# Altium footprint library Horizont_11_12_2017.PcbLib: 257 footprints (part 14 of 17)
Each footprint in its own frame and in the unit in brackets; x right, y up, seen from the top. Pads: shape width x height; smd on the part's side, far side on the other; paste and mask are expansions set on the pad; w line width, h text height; cw(c..) or ccw(c..) is an arc to the next point about the centre after c.
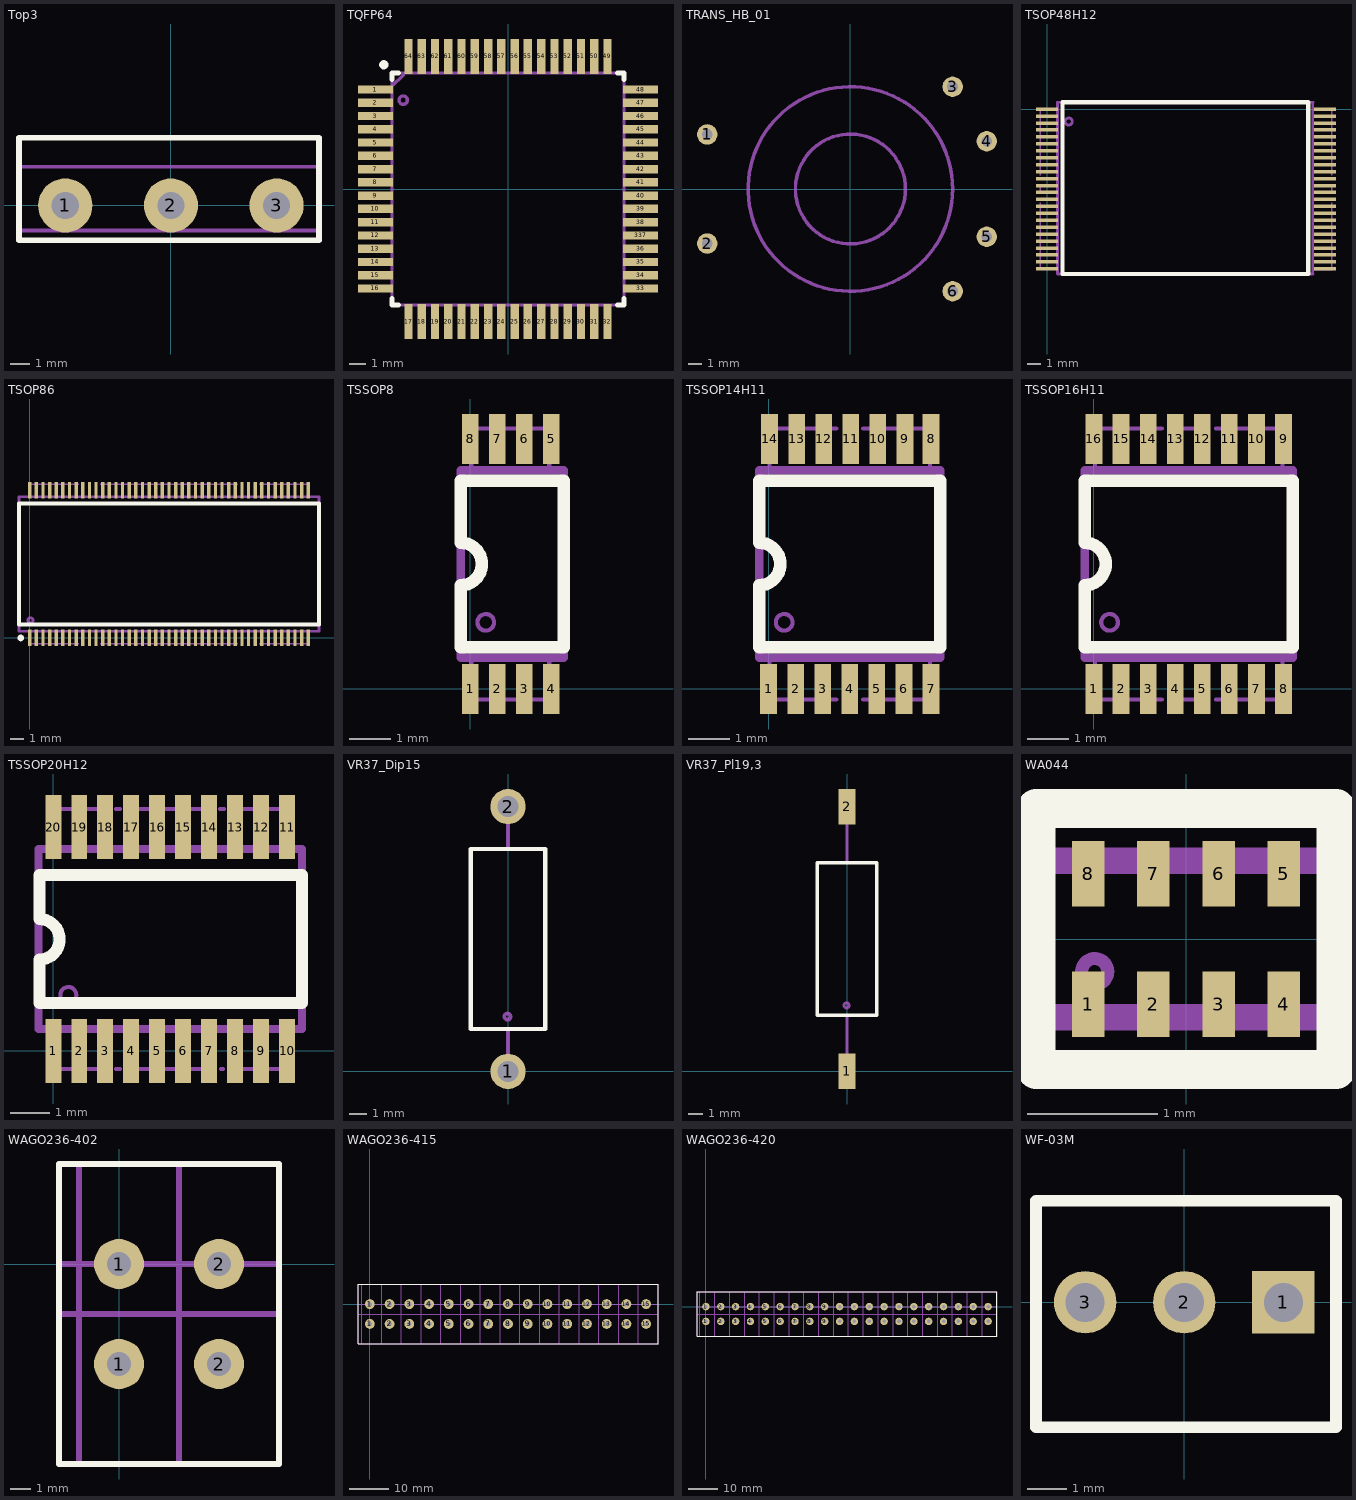
[diagram p13: the footprints below, top view; thin cyan lines are the x and y axes]

## Top3 [mm]
height 26.5
pads (3):
  round 2.8 hole 1.4: 1(-5.46,0) 2(0,0) 3(5.46,0)
Top Overlay:
  lines w0.3: -7.85,-1.8 7.65,-1.8 7.65,3.5 -7.85,3.5 -7.85,-1.8
Mechanical 1:
  lines w0.2: -7.85,2 7.65,2 ; -7.85,-1.3 -7.85,3.5 7.65,3.5 7.65,-1.3 -7.85,-1.3
  text ".Designator" at -2.9,-0.3 h1.5
3D body "top3.stp": height 28.1, standoff -3, extent -7.75,-1.4 7.75,3.2

## TQFP64 [mm]
height 1.2
pads (64):
  rect 2.1x0.5 smd: 1(-8,6) 2(-8,5.2) 3(-8,4.4) 4(-8,3.6) 5(-8,2.8) 6(-8,2) 7(-8,1.2) 8(-8,0.4) 9(-8,-0.4) 10(-8,-1.2) 11(-8,-2) 12(-8,-2.8) 13(-8,-3.6) 14(-8,-4.4) 15(-8,-5.2) 16(-8,-6) 33(8,-6) 34(8,-5.2) 35(8,-4.4) 36(8,-3.6) 38(8,-2) 39(8,-1.2) 40(8,-0.4) 41(8,0.4) 42(8,1.2) 43(8,2) 44(8,2.8) 45(8,3.6) 46(8,4.4) 47(8,5.2) 48(8,6) 337(8,-2.8)
  rect 0.5x2.1 smd: 17(-6,-8) 18(-5.2,-8) 19(-4.4,-8) 20(-3.6,-8) 21(-2.8,-8) 22(-2,-8) 23(-1.2,-8) 24(-0.4,-8) 25(0.4,-8) 26(1.2,-8) 27(2,-8) 28(2.8,-8) 29(3.6,-8) 30(4.4,-8) 31(5.2,-8) 32(6,-8) 49(6,8) 50(5.2,8) 51(4.4,8) 52(3.6,8) 53(2.8,8) 54(2,8) 55(1.2,8) 56(0.4,8) 57(-0.4,8) 58(-1.2,8) 59(-2,8) 60(-2.8,8) 61(-3.6,8) 62(-4.4,8) 63(-5.2,8) 64(-6,8)
Top Overlay:
  circle w0.3: c-7.493,7.493 r0.127
  lines w0.3: -7,-6.604 -7,-7 -6.604,-7 ; -7,6.604 -7,7 -6.604,7 ; 6.604,-7 7,-7 7,-6.604 ; 6.604,7 7,7 7,6.604
Mechanical 1:
  circle w0.2: c-6.321,5.359 r0.254
  lines w0.2: -7,0 -7,7 7,7 7,-7 -7,-7 -7,-0.1 -7,0.1 ; -7,6.2 -6.3,6.9 -6.3,7
  text "64" at -5.207,5.588 h1.5
  text ".Designator" at -2.377,-0.173 h1.5
3D body "TQFP64_14x14_0,8.STEP": height 1.2, standoff 0, extent -8,-8 8,8

## TRANS_HB_01 [mm]
height 4.2
pads (6):
  round 1.5 hole 0.8: 1(-10.5,4) 2(-10.5,-4) 3(7.5,7.5) 4(10,3.5) 5(10,-3.5) 6(7.5,-7.5)
Mechanical 1:
  circle w0.254: c0,0 r4.031
  circle w0.254: c0,0 r7.5
  text "6" at 8.5,-7 h2
  text "5" at 11,-3 h2
  text "3" at 8.5,8.5 h2
  text "4" at 11,4 h2
  text "2" at -12.5,-4 h2
  text "1" at -12.5,4 h2
  text ".Designator" at -3,10 h1.5

## TSOP48H12 [mm]
height 1.2
pads (48):
  rect 1.6x0.25 smd: 1(0,0) 2(0,-0.5) 3(0,-1) 4(0,-1.5) 5(0,-2) 6(0,-2.5) 7(0,-3) 8(0,-3.5) 9(0,-4) 10(0,-4.5) 11(0,-5) 12(0,-5.5) 13(0,-6) 14(0,-6.5) 15(0,-7) 16(0,-7.5) 17(0,-8) 18(0,-8.5) 19(0,-9) 20(0,-9.5) 21(0,-10) 22(0,-10.5) 23(0,-11) 24(0,-11.5) 25(20,-11.5) 26(20,-11) 27(20,-10.5) 28(20,-10) 29(20,-9.5) 30(20,-9) 31(20,-8.5) 32(20,-8) 33(20,-7.5) 34(20,-7) 35(20,-6.5) 36(20,-6) 37(20,-5.5) 38(20,-5) 39(20,-4.5) 40(20,-4) 41(20,-3.5) 42(20,-3) 43(20,-2.5) 44(20,-2) 45(20,-1.5) 46(20,-1) 47(20,-0.5) 48(20,0)
Top Overlay:
  lines w0.3: 1.1,-11.875 18.8,-11.875 18.8,0.5 1.1,0.5 1.1,-11.875
Mechanical 1:
  circle w0.2: c1.554,-0.891 r0.254
  lines w0.1: -0.5,-11.5 -0.5,-6.75 ; -0.5,-6 -0.5,-5.5 ; -0.5,-4.75 -0.5,0 ; 20.5,-11.5 20.5,-6.75 ; 20.5,-6 20.5,-5.5 ; 20.5,-4.75 20.5,0
  lines w0.2: -0.5,-11.5 0.75,-11.5 ; -0.5,0 0.75,0 ; 19.125,-11.875 19.125,0.5 ; 19.15,-11.875 0.75,-11.875 0.75,0.5 19.15,0.5 ; 19.25,-11.5 20.5,-11.5 ; 19.25,0 20.5,0
  text ".Designator" at 6.873,-5.173 h1.5
  text "48" at 17.4,-1 h1.5
  text ".Comment" at 7.11,-6.65 h1.5
3D body "TSOP48-05h11.stp": height 1.21, standoff 0, extent -0.55,-12 20.45,0.5

## TSOP86 [mm]
height 1.2
pads (86):
  rect 0.25x1.25 smd: 1(0,0) 2(0.5,0) 3(1,0) 4(1.5,0) 5(2,0) 6(2.5,0) 7(3,0) 8(3.5,0) 9(4,0) 10(4.5,0) 11(5,0) 12(5.5,0) 13(6,0) 14(6.5,0) 15(7,0) 16(7.5,0) 17(8,0) 18(8.5,0) 19(9,0) 20(9.5,0) 21(10,0) 22(10.5,0) 23(11,0) 24(11.5,0) 25(12,0) 26(12.5,0) 27(13,0) 28(13.5,0) 29(14,0) 30(14.5,0) 31(15,0) 32(15.5,0) 33(16,0) 34(16.5,0) 35(17,0) 36(17.5,0) 37(18,0) 38(18.5,0) 39(19,0) 40(19.5,0) 41(20,0) 42(20.5,0) 43(21,0) 44(21,11.15) 45(20.5,11.15) 46(20,11.15) 47(19.5,11.15) 48(19,11.15) 49(18.5,11.15) 50(18,11.15) 51(17.5,11.15) 52(17,11.15) 53(16.5,11.15) 54(16,11.15) 55(15.5,11.15) 56(15,11.15) 57(14.5,11.15) 58(14,11.15) 59(13.5,11.15) 60(13,11.15) 61(12.5,11.15) 62(12,11.15) 63(11.5,11.15) 64(11,11.15) 65(10.5,11.15) 66(10,11.15) 67(9.5,11.15) 68(9,11.15) 69(8.5,11.15) 70(8,11.15) 71(7.5,11.15) 72(7,11.15) 73(6.5,11.15) 74(6,11.15) 75(5.5,11.15) 76(5,11.15) 77(4.5,11.15) 78(4,11.15) 79(3.5,11.15) 80(3,11.15) 81(2.5,11.15) 82(2,11.15) 83(1.5,11.15) 84(1,11.15) 85(0.5,11.15) 86(0,11.15)
Top Overlay:
  circle w0.25: c-0.675,0 r0.125
  lines w0.3: -0.8,1.025 21.8,1.025 21.8,10.125 -0.8,10.125 -0.8,1.025
Mechanical 1:
  circle w0.2: c0.05,1.325 r0.2
  lines w0.1: 0,-0.425 3.7,-0.425 ; 0,11.575 3.7,11.575 ; 4.4,-0.425 4.6,-0.425 ; 4.4,11.575 4.6,11.575 ; 5.3,-0.425 15.7,-0.425 ; 5.3,11.575 15.7,11.575 ; 16.4,-0.425 16.6,-0.425 ; 16.4,11.575 16.6,11.575 ; 17.3,-0.425 21,-0.425 ; 17.3,11.575 21,11.575
  lines w0.2: 0,-0.425 0,0.495 ; 0,10.655 0,11.575 ; 21,-0.425 21,0.495 ; 21,10.655 21,11.575 ; -0.81,0.495 21.81,0.495 21.81,10.655 -0.81,10.655 -0.81,0.495
  text ".Designator" at 8.373,5.402 h1.5
  text "86" at -0.25,9.325 h1.5
3D body "TSOP86-05h12.stp": height 1.21, standoff 0, extent -0.81,-0.305 21.81,11.455

## TSSOP8 [mm]
pads (8):
  rect 0.4x1.2 smd: 1(0,0) 2(0.65,0) 3(1.3,0) 4(1.95,0) 5(1.95,6) 6(1.3,6) 7(0.65,6) 8(0,6)
Top Overlay:
  lines w0.3: -0.225,1 2.25,1 2.25,5 -0.225,5 -0.225,3.508 cw(c-0.225,3) -0.225,2.492 -0.225,1
Mechanical 1:
  circle w0.1: c0.375,1.6 r0.2
  lines w0.1: 0.025,0.75 0.025,-0.25 1.9,-0.25 1.9,0.75 ; 0.025,5.25 0.025,6.25 1.9,6.25 1.9,5.25
  lines w0.2: -0.225,0.75 2.25,0.75 2.25,5.25 -0.225,5.25 -0.225,0.75
  text "14" at 0.2,3.87 h1.5
  text ".Comment" at 0.36,2.1 h1.5
  text ".Designator" at 1.62,3.58 h1.5
3D body "TSSOP8.STEP": height 1, standoff 0, extent -0.5,-0.14 2.5,6.14

## TSSOP14H11 [mm]
height 1.1
pads (14):
  rect 0.4x1.2 smd: 1(0,0) 2(0.65,0) 3(1.3,0) 4(1.95,0) 5(2.6,0) 6(3.25,0) 7(3.9,0) 8(3.9,6) 9(3.275,6) 10(2.625,6) 11(1.975,6) 12(1.325,6) 13(0.675,6) 14(0.025,6)
Top Overlay:
  lines w0.3: -0.225,1 -0.225,2.492 ccw(c-0.225,3) -0.225,3.508 -0.225,5 4.125,5 4.125,1 -0.225,1
Mechanical 1:
  circle w0.1: c0.375,1.6 r0.2
  lines w0.1: 0.025,0.75 0.025,-0.25 1.625,-0.25 ; 0.025,5.25 0.025,6.25 1.625,6.25 ; 1.9,-0.25 2,-0.25 ; 1.9,6.25 2,6.25 ; 2.275,-0.25 3.875,-0.25 3.875,0.75 ; 2.275,6.25 3.875,6.25 3.875,5.25
  lines w0.2: -0.225,0.75 -0.225,5.25 4.125,5.25 4.125,0.75 -0.225,0.75
  text ".Designator" at 1.62,3.58 h1.5
  text ".Comment" at 0.36,2.1 h1.5
  text "14" at 0.2,3.87 h1.5
3D body "TSSOP14h11.stp": height 1.11, standoff 0, extent -0.375,-0.3 4.275,6.3

## TSSOP16H11 [mm]
height 1.1
pads (16):
  rect 0.4x1.2 smd: 1(0,0) 2(0.65,0) 3(1.3,0) 4(1.95,0) 5(2.6,0) 6(3.25,0) 7(3.9,0) 8(4.55,0) 9(4.55,6) 10(3.9,6) 11(3.25,6) 12(2.6,6) 13(1.95,6) 14(1.3,6) 15(0.65,6) 16(0,6)
Top Overlay:
  lines w0.3: -0.225,1 4.775,1 4.775,5 -0.225,5 -0.225,3.508 cw(c-0.225,3) -0.225,2.492 -0.225,1
Mechanical 1:
  circle w0.1: c0.375,1.6 r0.2
  lines w0.1: 0.025,0.75 0.025,-0.25 1.625,-0.25 ; 0.025,5.25 0.025,6.25 1.625,6.25 ; 2.075,-0.25 2.475,-0.25 ; 2.075,6.25 2.475,6.25 ; 2.925,-0.25 4.525,-0.25 4.525,0.75 ; 2.925,6.25 4.525,6.25 4.525,5.25
  lines w0.2: -0.225,0.75 4.775,0.75 4.775,5.25 -0.225,5.25 -0.225,0.75
  text "16" at 0.2,3.87 h1.5
  text ".Comment" at 0.36,2.1 h1.5
  text ".Designator" at 1.62,3.58 h1.5
3D body "TSSOP16h11.stp": height 1.11, standoff 0, extent -0.375,-0.3 4.925,6.3

## TSSOP20H12 [mm]
height 1.2
pads (20):
  rect 0.4x1.6 smd: 1(0,0) 2(0.65,0) 3(1.3,0) 4(1.95,0) 5(2.6,0) 6(3.25,0) 7(3.9,0) 8(4.55,0) 9(5.2,0) 10(5.85,0) 11(5.85,5.6) 12(5.2,5.6) 13(4.55,5.6) 14(3.9,5.6) 15(3.25,5.6) 16(2.6,5.6) 17(1.95,5.6) 18(1.3,5.6) 19(0.65,5.6) 20(0,5.6)
Top Overlay:
  lines w0.3: -0.35,1.2 6.225,1.2 6.225,4.4 -0.35,4.4 -0.35,3.3 cw(c-0.35,2.792) -0.35,2.284 -0.35,1.2
Mechanical 1:
  circle w0.1: c0.375,1.4 r0.2
  lines w0.1: 0,6.05 1.3,6.05 ; 0.025,-0.45 1.3,-0.45 ; 1.575,-0.45 1.675,-0.45 ; 1.575,6.05 1.675,6.05 ; 1.95,-0.45 3.9,-0.45 ; 1.95,6.05 3.9,6.05 ; 4.175,6.05 4.275,6.05 ; 4.2,-0.45 4.25,-0.45 ; 4.55,-0.45 5.85,-0.45 ; 4.55,6.05 5.85,6.05
  lines w0.2: 0,-0.45 0,0.55 ; 0,5.05 0,6.05 ; 5.85,-0.45 5.85,0.55 ; 5.85,5.05 5.85,6.05 ; -0.375,0.55 6.225,0.55 6.225,5.05 -0.375,5.05 -0.375,0.55
  text "20" at 0.3,3.55 h1.5
  text ".Comment" at 0.39,1.88 h1.5
  text ".Designator" at 1.98,3.58 h1.5
3D body "TSSOP20h12.stp": height 1.21, standoff 0, extent -0.375,-0.5 6.225,6.1

## VR37_Dip15 [mm]
height 4
pads (2):
  round 2 hole 1.2: 1(0,0) 2(0,15)
Top Overlay:
  lines w0.25: -2.1,2.4 2.1,2.4 2.1,12.6 -2.1,12.6 -2.1,2.4
Mechanical 1:
  circle w0.2: c-0.03,3.1 r0.18
  lines w0.2: 0,0 0,2.4 ; 0,12.6 0,15 ; -2.1,2.4 2.1,2.4 2.1,12.6 -2.1,12.6 -2.1,2.4
  text ".Designator" at 0.4,6.1 h1.5
3D body "С2-33Н-0,5_Dip15.STEP": height 4.2, standoff -3, extent -2.15,-0.248 2.05,15.352

## VR37_Pl19,3 [mm]
height 4
pads (2):
  rect 1.2x2.5 smd: 1(0,0) 2(0,18.75)
Top Overlay:
  lines w0.25: -2.1,3.975 -2.1,14.775 2.1,14.775 2.1,3.975 -2.1,3.975
Mechanical 1:
  circle w0.2: c-0.03,4.675 r0.18
  lines w0.2: 0,-0.275 0,3.975 ; 0,14.775 0,19.025 ; -2.1,3.975 -2.1,14.775 2.1,14.775 2.1,3.975 -2.1,3.975
  text ".Designator" at 0.4,8.1 h1.5
3D body "С2-33Н-0,5_Pl19,3.STEP": height 4.2, standoff 0, extent -2.141,-0.308 2.059,18.992

## WA044 [mm]
height 0.55
pads (8):
  rect 0.25x0.5 smd paste+0 mask+0.05: 1(-0.75,-0.5) 2(-0.25,-0.5) 3(0.25,-0.5) 4(0.75,-0.5) 5(0.75,0.5) 6(0.25,0.5) 7(-0.25,0.5) 8(-0.75,0.5)
Top Overlay:
  lines w0.3: -1.15,-1 -1.15,1 1.15,1 1.15,-1 -1.15,-1
Mechanical 1:
  circle w0.1: c-0.7,-0.25 r0.1
  lines w0.2: -1.15,-0.6 1.15,-0.6 1.15,0.6 -1.15,0.6 -1.15,-0.6
  text "8" at -1.15,0.9 h1.5
  text ".Designator" at -1.65,-2.3 h1.5
3D body "WA044.STEP": height 0.55, standoff 0, extent -1.1,-0.6 1.1,0.6

## WAGO236-402 [mm]
height 13
pads (4):
  round 2.5 hole 1.2: 1(0,-5) 1(0,0) 2(5,-5) 2(5,0)
Top Overlay:
  lines w0.3: -3,-10 8,-10 8,5 -3,5 -3,-10
Mechanical 1:
  circle w0.1: c0.05,-5.42 r0.1
  lines w0.3: -3,-2.5 -2,-2.5 3,-2.5 8,-2.5 ; -3,0 -2,0 3,0 8,0 ; -2,-10 3,-10 ; -2,-10 -2,5 ; -2,-10 -3,-10 -3,5 -2,5 ; -2,5 2.5,5 3,5 ; 3,-10 3,5 ; 3,-10 8,-10 8,5 7.5,5 3,5
  text ".Designator" at -0.6,6.1 h1.5
  text "2" at 4.8,-5.5 h1.5
3D body "WAGO236-402.STEP": height 13.01, standoff -3.99, extent -3,-10 8,5

## WAGO236-415 [mm]
height 13
pads (30):
  round 2.5 hole 1.2: 1(0,-5) 1(0,0) 2(5,-5) 2(5,0) 3(10,-5) 3(10,0) 4(15,-5) 4(15,0) 5(20,-5) 5(20,0) 6(25,-5) 6(25,0) 7(30,-5) 7(30,0) 8(35,-5) 8(35,0) 9(40,-5) 9(40,0) 10(45,-5) 10(45,0) 11(50,-5) 11(50,0) 12(55,-5) 12(55,0) 13(60,-5) 13(60,0) 14(65,-5) 14(65,0) 15(70,-5) 15(70,0)
Top Overlay:
  lines w0.3: -3,-10 -3,5 73,5 73,-10 -3,-10
Mechanical 1:
  circle w0.1: c0.05,-5.42 r0.1
  lines w0.3: -3,-2.5 -2,-2.5 3,-2.5 8,-2.5 13,-2.5 18,-2.5 23,-2.5 28,-2.5 33,-2.5 38,-2.5 43,-2.5 48,-2.5 53,-2.5 58,-2.5 63,-2.5 68,-2.5 73,-2.5 ; -3,0 -2,0 3,0 8,0 13,0 18,0 23,0 28,0 33,0 38,0 43,0 48,0 53,0 58,0 63,0 68,0 73,0 ; -2,-10 -3,-10 -3,5 -2,5 ; -2,-10 -2,5 ; -2,-10 3,-10 ; -2,5 2.5,5 3,5 ; 3,-10 8,-10 ; 3,-10 3,5 ; 3,5 7.5,5 8,5 ; 8,-10 13,-10 ; 8,-10 8,5 ; 8,5 12.5,5 13,5 ; 13,-10 18,-10 ; 13,-10 13,5 ; 13,5 17.5,5 18,5 ; 18,-10 23,-10 ; 18,-10 18,5 ; 18,5 22.5,5 23,5 ; 23,-10 28,-10 ; 23,-10 23,5 ; 23,5 27.5,5 28,5 ; 28,-10 33,-10 ; 28,-10 28,5 ; 28,5 32.5,5 33,5 ; 33,-10 38,-10 ; 33,-10 33,5 ; 33,5 37.5,5 38,5 ; 38,-10 43,-10 ; 38,-10 38,5 ; 38,5 42.5,5 43,5 ; 43,-10 48,-10 ; 43,-10 43,5 ; 43,5 47.5,5 48,5 ; 48,-10 53,-10 ; 48,-10 48,5 ; 48,5 52.5,5 53,5 ; 53,-10 58,-10 ; 53,-10 53,5 ; 53,5 57.5,5 58,5 ; 58,-10 63,-10 ; 58,-10 58,5 ; 58,5 62.5,5 63,5 ; 63,-10 68,-10 ; 63,-10 63,5 ; 63,5 67.5,5 68,5 ; 68,-10 73,-10 73,5 72.5,5 68,5 ; 68,-10 68,5
  text "15" at 69.5,-7.6 h1.5
  text ".Designator" at 40.5,6 h1.5
3D body "WAGO236-415.STEP": height 13.01, standoff -3.99, extent -3,-10 73,5

## WAGO236-420 [mm]
height 13
pads (40):
  round 2.5 hole 1.2: 1(0,-5) 1(0,0) 2(5,-5) 2(5,0) 3(10,-5) 3(10,0) 4(15,-5) 4(15,0) 5(20,-5) 5(20,0) 6(25,-5) 6(25,0) 7(30,-5) 7(30,0) 8(35,-5) 8(35,0) 9(40,-5) 9(40,0) 10(45,-5) 10(45,0) 11(50,-5) 11(50,0) 12(55,-5) 12(55,0) 13(60,-5) 13(60,0) 14(65,-5) 14(65,0) 15(70,-5) 15(70,0) 16(75,-5) 16(75,0) 17(80,-5) 17(80,0) 18(85,-5) 18(85,0) 19(90,-5) 19(90,0) 20(95,-5) 20(95,0)
Top Overlay:
  lines w0.3: -3,-10 -3,5 98,5 98,-10 -3,-10
Mechanical 1:
  circle w0.1: c0.05,-5.42 r0.1
  lines w0.3: -3,-2.5 -2,-2.5 3,-2.5 8,-2.5 13,-2.5 18,-2.5 23,-2.5 28,-2.5 33,-2.5 38,-2.5 43,-2.5 48,-2.5 53,-2.5 58,-2.5 63,-2.5 68,-2.5 73,-2.5 78,-2.5 83,-2.5 88,-2.5 93,-2.5 98,-2.5 ; -3,0 -2,0 3,0 8,0 13,0 18,0 23,0 28,0 33,0 38,0 43,0 48,0 53,0 58,0 63,0 68,0 73,0 78,0 83,0 88,0 93,0 98,0 ; -2,-10 -3,-10 -3,5 -2,5 ; -2,-10 -2,5 ; -2,-10 3,-10 ; -2,5 2.5,5 3,5 ; 3,-10 8,-10 ; 3,-10 3,5 ; 3,5 7.5,5 8,5 ; 8,-10 13,-10 ; 8,-10 8,5 ; 8,5 12.5,5 13,5 ; 13,-10 18,-10 ; 13,-10 13,5 ; 13,5 17.5,5 18,5 ; 18,-10 23,-10 ; 18,-10 18,5 ; 18,5 22.5,5 23,5 ; 23,-10 28,-10 ; 23,-10 23,5 ; 23,5 27.5,5 28,5 ; 28,-10 33,-10 ; 28,-10 28,5 ; 28,5 32.5,5 33,5 ; 33,-10 38,-10 ; 33,-10 33,5 ; 33,5 37.5,5 38,5 ; 38,-10 43,-10 ; 38,-10 38,5 ; 38,5 42.5,5 43,5 ; 43,-10 48,-10 ; 43,-10 43,5 ; 43,5 47.5,5 48,5 ; 48,-10 53,-10 ; 48,-10 48,5 ; 48,5 52.5,5 53,5 ; 53,-10 58,-10 ; 53,-10 53,5 ; 53,5 57.5,5 58,5 ; 58,-10 63,-10 ; 58,-10 58,5 ; 58,5 62.5,5 63,5 ; 63,-10 68,-10 ; 63,-10 63,5 ; 63,5 67.5,5 68,5 ; 68,-10 73,-10 ; 68,-10 68,5 ; 68,5 72.5,5 73,5 ; 73,-10 78,-10 ; 73,-10 73,5 ; 73,5 77.5,5 78,5 ; 78,-10 83,-10 ; 78,-10 78,5 ; 78,5 82.5,5 83,5 ; 83,-10 88,-10 ; 83,-10 83,5 ; 83,5 87.5,5 88,5 ; 88,-10 93,-10 ; 88,-10 88,5 ; 88,5 92.5,5 93,5 ; 93,-10 98,-10 98,5 97.5,5 93,5 ; 93,-10 93,5
  text "20" at 95,-7.5 h1.5
  text ".Designator" at 40.5,6 h1.5
3D body "WAGO236-420.STEP": height 13.01, standoff -3.99, extent -3,-10 98,5

## WF-03M [mm]
height 14.2
pads (3):
  rect 1.6x1.6 hole 1: 1(2.54,0)
  round 1.6 hole 1: 2(0,0) 3(-2.54,0)
Top Overlay:
  lines w0.3: -3.8,-3.2 -3.8,2.6 3.89,2.6 3.89,-3.2 -3.8,-3.2
Mechanical 1:
  lines w0.2: -3.8,-3.2 -3.8,2.6 3.89,2.6 3.89,-3.2 -3.8,-3.2
  text ".Designator" at -3.27,3.4 h1.5
  text "3" at -2.86,-0.5 h1.5
  text "1" at 2.19,-0.6 h1.5
3D body "WF-03M.STEP": height 11.5, standoff -3.4, extent -3.83,-3.2 3.83,2.6